# Altium footprint library others.PcbLib: 50 footprints (part 2 of 4)
Each footprint in its own frame and in the unit in brackets; x right, y up, seen from the top. Pads: shape width x height; smd on the part's side, far side on the other; paste and mask are expansions set on the pad; w line width, h text height; cw(c..) or ccw(c..) is an arc to the next point about the centre after c.
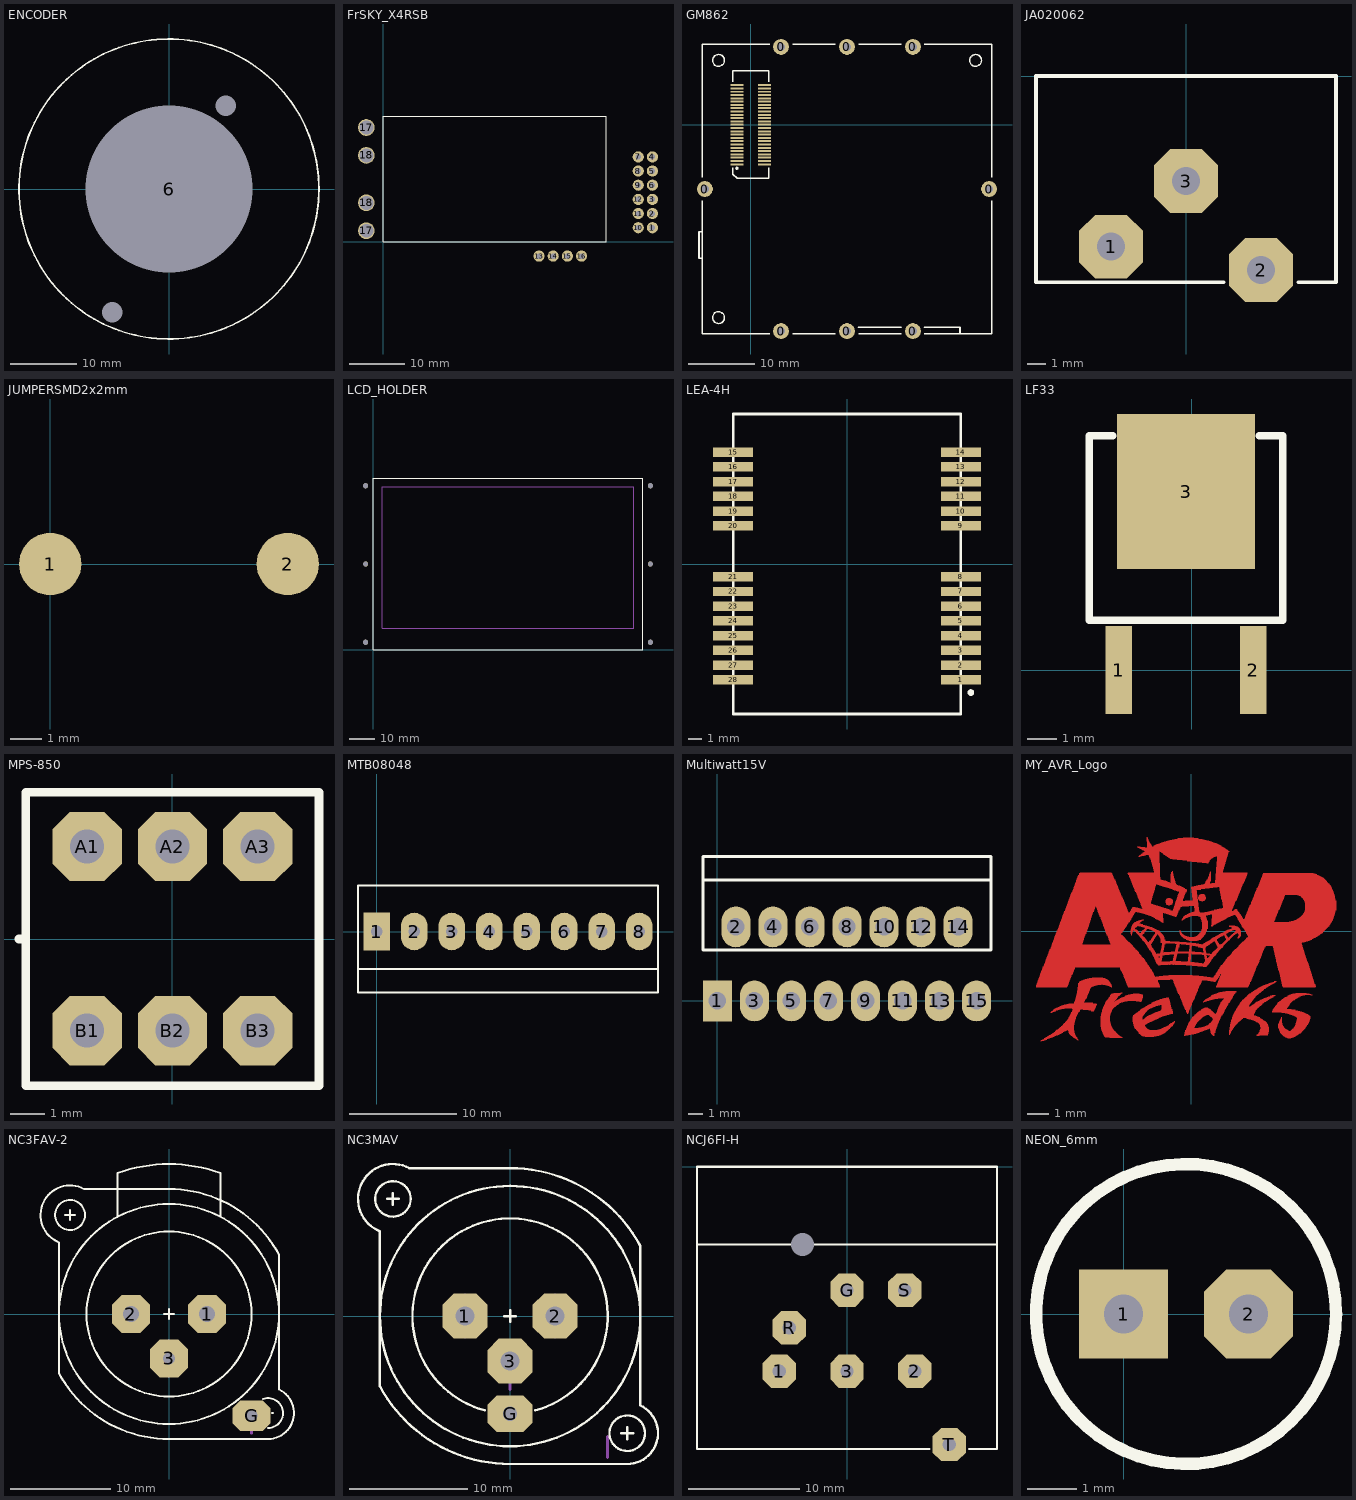
[diagram p1: the footprints below, top view; thin cyan lines are the x and y axes]

## ENCODER [mm]
pads (3):
  oct 0x0 hole 3.1: 4(8.5,12.5) 5(-8.5,-18.5)
  oct 5x5 hole 25: 6(0,0)
Component Side:
  text "Select" at -21.5,13.3 h6
  text "Adjust" at 14,21 h6
Top Overlay:
  circle w0.254: c0,0 r22.5

## FrSKY_X4RSB [mm]
pads (20):
  round 2 hole 1: 1(48.26,2.54) 2(48.26,5.08) 3(48.26,7.62) 4(48.26,15.24) 5(48.26,12.7) 6(48.26,10.16) 7(45.72,15.24) 8(45.72,12.7) 9(45.72,10.16) 10(45.72,2.54) 11(45.72,5.08) 12(45.72,7.62) 13(27.94,-2.54) 14(30.48,-2.54) 15(33.02,-2.54) 16(35.56,-2.54)
  round 3 hole 2.5: 17(-3,2) 17(-3,20.5) 18(-3,7) 18(-3,15.5)
Top Overlay:
  lines w0.2: 0,0 40,0 40,22.5 0,22.5 0,0
3D body: height 6, standoff 0, extent 0,0 40,22.5

## GM862 [mm] "GM862 GSM Module"
height 9.4
pads (58):
  round 2.4 hole 1.2: 0(-6.95,-9.75) 0(4.6,-31.3) 0(4.6,11.8) 0(14.6,-31.3) 0(14.6,11.8) 0(24.6,-31.3) 0(24.6,11.8) 0(36.15,-9.75)
  rect 2x0.3 smd: 1(-2.1,-6) 2(2.1,-6) 3(-2.1,-5.5) 4(2.1,-5.5) 5(-2.1,-5) 6(2.1,-5) 7(-2.1,-4.5) 8(2.1,-4.5) 9(-2.1,-4) 10(2.1,-4) 11(-2.1,-3.5) 12(2.1,-3.5) 13(-2.1,-3) 14(2.1,-3) 15(-2.1,-2.5) 16(2.1,-2.5) 17(-2.1,-2) 18(2.1,-2) 19(-2.1,-1.5) 20(2.1,-1.5) 21(-2.1,-1) 22(2.1,-1) 23(-2.1,-0.5) 24(2.1,-0.5) 25(-2.1,0) 26(2.1,0) 27(-2.1,0.5) 28(2.1,0.5) 29(-2.1,1) 30(2.1,1) 31(-2.1,1.5) 32(2.1,1.5) 33(-2.1,2) 34(2.1,2) 35(-2.1,2.5) 36(2.1,2.5) 37(-2.1,3) 38(2.1,3) 39(-2.1,3.5) 40(2.1,3.5) 41(-2.1,4) 42(2.1,4) 43(-2.1,4.5) 44(2.1,4.5) 45(-2.1,5) 46(2.1,5) 47(-2.1,5.5) 48(2.1,5.5) 49(-2.1,6) 50(2.1,6)
Top Overlay:
  circle w0.2: c-4.9,-29.25 r0.9
  circle w0.2: c34.1,9.75 r0.9
  circle w0.25: c-2.1,-6.6 r0.125
  circle w0.2: c-4.9,9.75 r0.9
  lines w0.2: -7.35,-11.5 -7.35,-31.7 2.85,-31.7 ; -7.35,-8 -7.35,12.2 2.85,12.2 ; -2.7,-6.5 -2.7,-7.5 -2.05,-8.15 2.7,-8.15 2.7,-6.5 ; -2.7,6.5 -2.7,8.15 2.7,8.15 2.7,6.5 ; 6.35,-31.7 12.85,-31.7 ; 6.35,12.2 12.85,12.2 ; 16.35,-31.7 22.85,-31.7 ; 16.35,12.2 22.85,12.2 ; 26.35,-31.7 36.55,-31.7 36.55,-11.5 ; 26.35,12.2 36.55,12.2 36.55,-8
  lines w0.254: -7.4,-20.25 -7.85,-20.25 -7.85,-16.25 -7.4,-16.25 ; 16.35,-30.7 22.85,-30.7 ; 26.35,-30.7 31.75,-30.7 31.75,-31.65

## JA020062 [mm]
pads (3):
  oct 3.4x3.4 hole 1.5: 1(-4,-9.1) 2(4,-10.35) 3(0,-5.6)
Top Overlay:
  lines w0.2: 2,-11 -8,-11 -8,0 8,0 8,-11 6,-11

## JUMPERSMD2x2mm [mm]
pads (2):
  round 2 smd: 1(0,0) 2(7.62,0)

## LCD_HOLDER [mm]
pads (6):
  round 2 hole 2: 0(-3,3) 0(108.5,3) 1(-3,64.3) 1(108.5,64.3) 2(-3,33.65) 2(108.5,33.65)
Top Overlay:
  lines w0.254: 0,0 105.5,0 105.5,67.3 0,67.3 0,0
Bottom Overlay:
  lines w0.254: -6,0 111.5,0 111.5,67.3 -6,67.3 -6,0
Mechanical 15:
  lines w0.254: 3.5,8.5 102,8.5 102,64 3.5,64 3.5,8.5

## LEA-4H [mm] "GPS Receiver Module"
height 3.3
pads (28):
  rect 3x0.7 smd: 1(8.5,-8.65) 2(8.5,-7.55) 3(8.5,-6.45) 4(8.5,-5.35) 5(8.5,-4.25) 6(8.5,-3.15) 7(8.5,-2.05) 8(8.5,-0.95) 9(8.5,2.85) 10(8.5,3.95) 11(8.5,5.05) 12(8.5,6.15) 13(8.5,7.25) 14(8.5,8.35) 15(-8.5,8.35) 16(-8.5,7.25) 17(-8.5,6.15) 18(-8.5,5.05) 19(-8.5,3.95) 20(-8.5,2.85) 21(-8.5,-0.95) 22(-8.5,-2.05) 23(-8.5,-3.15) 24(-8.5,-4.25) 25(-8.5,-5.35) 26(-8.5,-6.45) 27(-8.5,-7.55) 28(-8.5,-8.65)
Top Overlay:
  circle w0.25: c9.25,-9.6 r0.125
  lines w0.2: -8.5,-11.2 8.5,-11.2 8.5,11.2 -8.5,11.2 -8.5,-11.2

## LF33 [mm]
pads (3):
  rect 0.9x3 smd: 1(-2.5,0) 2(2.1,0)
  rect 4.7x5.3 smd: 3(-0.2,6.1)
Top Overlay:
  lines w0.254: -2.7,8 -3.5,8 -3.5,1.7 1.9,1.7 3.1,1.7 3.1,8 2.3,8

## MPS-850 [mil]
pads (6):
  oct 80x80 hole 39.37: A1(-98.43,106.79) A2(0,106.79) A3(98.43,106.79) B1(-98.43,-105.81) B2(0,-105.81) B3(98.43,-105.81)
Top Overlay:
  lines w10: -177.17,0 -169.29,0 ; -169.29,-169.29 -169.29,169.29 169.29,169.29 169.29,-169.29 -169.29,-169.29

## MTB08048 [mm]
height 10
pads (8):
  rect 2.5x3.5 hole 1.1: 1(0,0)
  oval 2.5x3.5 hole 1.1: 2(3.5,0) 3(7,0) 4(10.5,0) 5(14,0) 6(17.5,0) 7(21,0) 8(24.5,0)
Top Overlay:
  lines w0.2: -1.75,-3.5 26.25,-3.5 ; -1.75,-5.7 26.25,-5.7 26.25,4.3 -1.75,4.3 -1.75,-5.7

## Multiwatt15V [mm] "Multiwatt15V"
height 21
pads (15):
  rect 2x2.8 hole 1.2: 1(0,0)
  oval 2x2.8 hole 1.2: 2(1.27,5.08) 3(2.54,0) 4(3.81,5.08) 5(5.08,0) 6(6.35,5.08) 7(7.62,0) 8(8.89,5.08) 9(10.16,0) 10(11.43,5.08) 11(12.7,0) 12(13.97,5.08) 13(15.24,0) 14(16.51,5.08) 15(17.78,0)
Top Overlay:
  lines w0.2: -1,8.3 18.78,8.3 ; -1,3.5 18.78,3.5 18.78,9.9 -1,9.9 -1,3.5

## MY_AVR_Logo [mm]
Component Side:
  drawing of 2521 lines, arcs and shapes, not listed

## NC3FAV-2 [mm]
height 24
pads (4):
  oct 3.81x3.81 hole 1.6: 1(3.81,0) 2(-3.81,0)
  oct 3.81x3.81 hole 1.2: 3(0,-4.445)
  oct 3.81x3.048 hole 1.2: G(8.255,-10.16)
Top Overlay:
  circle w0.2: c0,0 r11
  circle w0.2: c-9.9,9.9 r1.5
  circle w0.2: c0,0 r8.25
  lines w0.2: -11.005,7.165 cw(c-9.9,9.9) -8.515,12.505 ; -11,-5.93 -11,7.16 ; -10.996,-5.945 ccw(c0,0) 0,-12.5 9.9,-12.5 ccw(c9.9,-9.9) 10.999,-7.544 ; -10.4,9.9 -9.4,9.9 ; -9.9,9.4 -9.9,10.4 ; -8.5,12.5 0,12.5 cw(c0,0) 10.996,5.945 ; -5.13,9.702 -5.13,14.095 cw(c0,0) 5.13,14.095 5.13,9.729 ; -0.5,0 0.5,0 ; 0,-0.5 0,0.5 ; 9.387,-8.49 cw(c9.9,-9.9) 9.9,-11.4 ; 10.3,-9.9 10.4,-9.9 ; 11,-7.54 11,5.93
Mechanical 4:
  lines w0.254: -3.816,-1.775 -3.816,1.781 ; -0.006,-6.22 -0.006,-2.664 ; 3.804,-1.775 3.804,1.781 ; 8.249,-11.935 8.249,-10.157

## NC3MAV [mm]
height 24
pads (4):
  oct 3.81x3.81 hole 1.6: 1(-3.81,0) 2(3.81,0) 3(0,-3.81)
  oct 3.81x3.048 hole 1.2: G(0,-8.255)
Top Overlay:
  circle w0.2: c0,0 r11
  circle w0.2: c-9.9,9.9 r1.5
  circle w0.2: c9.9,-9.9 r1.5
  lines w0.2: -11.005,7.165 cw(c-9.9,9.9) -8.515,12.505 ; -11,-5.93 -11,7.16 ; -10.996,-5.945 ccw(c0,0) 0,-12.5 9.9,-12.5 ccw(c9.9,-9.9) 10.999,-7.544 ; -10.4,9.9 -9.4,9.9 ; -9.9,9.4 -9.9,10.4 ; -8.5,12.5 0,12.5 cw(c0,0) 10.996,5.945 ; -2.135,-7.969 cw(c0,0) 2.135,-7.969 ; -0.5,0 0.5,0 ; 0,-0.5 0,0.5 ; 9.4,-9.9 10.4,-9.9 ; 9.9,-10.4 9.9,-9.4 ; 11,-7.54 11,5.93
Mechanical 4:
  lines w0.254: -3.816,-1.775 -3.816,1.781 ; -0.006,-6.22 -0.006,-2.664 ; 3.804,-1.775 3.804,1.781 ; 8.249,-11.935 8.249,-10.157

## NCJ6FI-H [mm]
pads (8):
  oct 3x3 hole 1.2: 1(-6.1,-18.4) 2(6.1,-18.4) 3(0,-18.4) G(0,-11.1) R(-5.2,-14.5) S(5.2,-11.1) T(9.2,-25)
  round 0 hole 2.1: ""(-4,-7)
Top Overlay:
  lines w0.2: -13.5,-7 13.5,-7 ; 7.4,-25.4 -13.5,-25.4 -13.5,0 13.5,0 13.5,-25.4 11,-25.4

## NEON_6mm [mm]
height 10
pads (2):
  rect 1.8x1.8 hole 0.8: 1(0,0)
  oct 1.8x1.8 hole 0.8: 2(2.54,0)
Top Overlay:
  circle w0.254: c1.27,0 r3.048